# Altium footprint library Atlan.PcbLib: 283 footprints (part 2 of 18)
Each footprint in its own frame and in the unit in brackets; x right, y up, seen from the top. Pads: shape width x height; smd on the part's side, far side on the other; paste and mask are expansions set on the pad; w line width, h text height; cw(c..) or ccw(c..) is an arc to the next point about the centre after c.
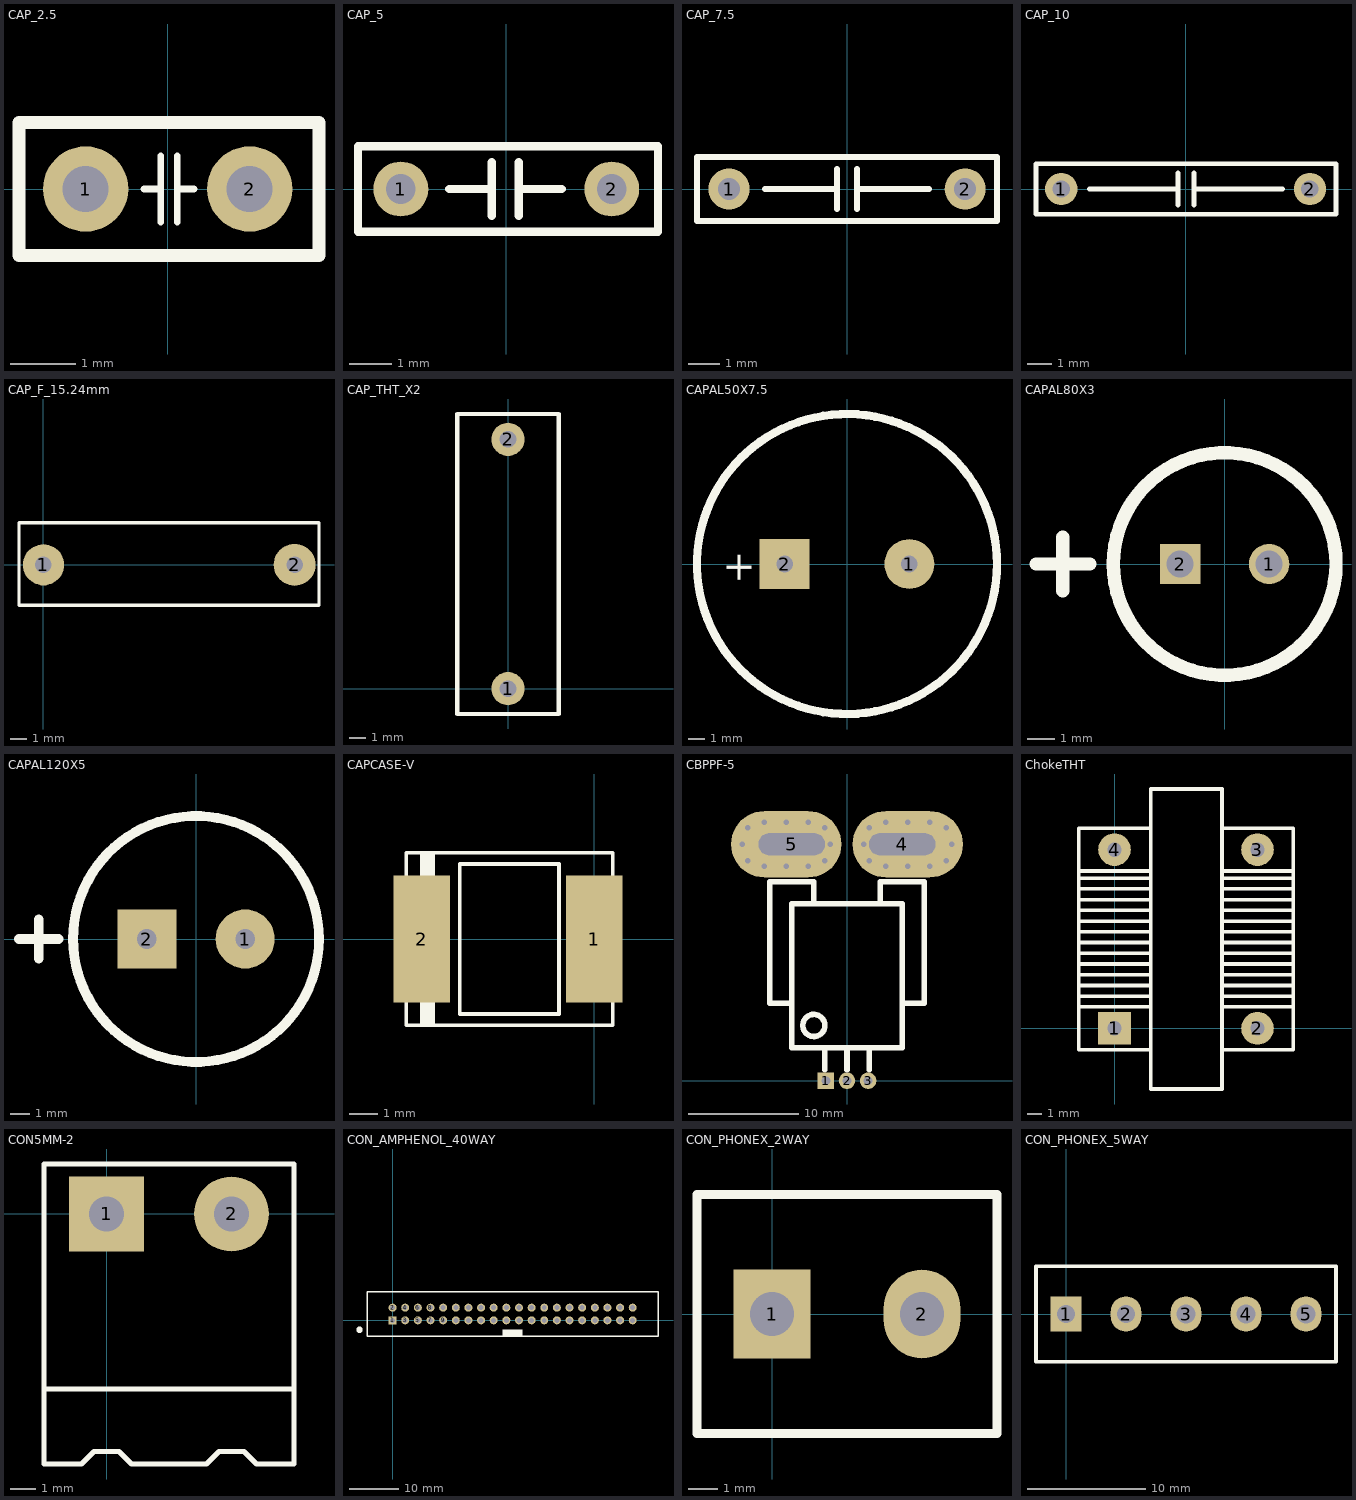
[diagram p1: the footprints below, top view; thin cyan lines are the x and y axes]

## CAP_2.5 [mm]
pads (2):
  round 1.3 hole 0.7: 1(-1.25,0) 2(1.25,0)
Top Overlay:
  lines w0.1: -0.361,0 -0.107,0 ; -0.107,-0.508 -0.107,0.508 ; 0.147,-0.508 0.147,0.508 ; 0.147,0 0.401,0
  lines w0.2: -2.266,-1.016 2.306,-1.016 2.306,1.016 -2.266,1.016 -2.266,-1.016

## CAP_5 [mm]
pads (2):
  round 1.3 hole 0.7: 1(-2.5,0) 2(2.5,0)
Top Overlay:
  lines w0.2: -1.357,0 -0.341,0 ; -0.341,-0.635 -0.341,0.635 ; 0.294,-0.635 0.294,0.635 ; 0.294,0 1.31,0 ; -3.516,-1.016 3.596,-1.016 3.596,1.016 -3.516,1.016 -3.516,-1.016

## CAP_7.5 [mm]
pads (2):
  round 1.3 hole 0.7: 1(-3.75,0) 2(3.75,0)
Top Overlay:
  lines w0.2: -2.607,0 -0.575,0 -0.321,0 ; -0.321,-0.635 -0.321,0.635 ; 0.314,-0.635 0.314,0.635 ; 0.314,0 0.695,0 2.6,0 ; -4.766,-1.016 -4.766,1.016 4.759,1.016 4.759,-1.016 -4.766,-1.016

## CAP_10 [mm]
pads (2):
  round 1.3 hole 0.7: 1(-5,0) 2(5,0)
Top Overlay:
  lines w0.2: -3.857,0 -0.301,0 ; -0.301,-0.635 -0.301,0.635 ; 0.334,-0.635 0.334,0.635 ; 0.334,0 3.89,0 ; -6.016,-1.016 6.049,-1.016 6.049,1.016 -6.016,1.016 -6.016,-1.016

## CAP_F_15.24mm [mm]
pads (2):
  round 2.5 hole 1: 1(0,0)
  round 2.54 hole 1: 2(15.24,0)
Top Overlay:
  lines w0.2: -1.48,-2.45 -1.48,2.55 16.72,2.55 16.72,-2.45 -1.48,-2.45
3D body: height 10.5, standoff 0, extent -1.5,-2.5 16.8,2.6

## CAP_THT_X2 [mm] "X2 capacitor"
height 20
pads (2):
  round 2 hole 1: 1(0,0) 2(0,14.986)
Top Overlay:
  lines w0.254: -3.048,-1.524 3.048,-1.524 3.048,16.51 -3.048,16.51 -3.048,-1.524

## CAPAL50X7.5 [mm]
height 50
pads (2):
  round 3 hole 1: 1(3.75,0)
  rect 3x3 hole 1: 2(-3.75,0)
Top Overlay:
  circle w0.5: c0,0 r9.017
  text "+" at -7.8,0.8 h3
3D body: height 50, standoff 0, extent -8.93,-9.039 8.999,8.925

## CAPAL80X3 [mm]
pads (2):
  round 1.5 hole 1: 1(1.65,0)
  rect 1.5x1.5 hole 1: 2(-1.65,0)
Top Overlay:
  circle w0.5: c0,0 r4.13
  lines w0.5: -7,0 -5,0 ; -6,-1 -6,1
3D body "CAPAL80X3.STEP": height 13.24, standoff -1.94, extent -4.1,-4.141 4.152,4.1

## CAPAL120X5 [mm]
pads (2):
  round 3 hole 1: 1(2.5,0)
  rect 3x3 hole 1: 2(-2.5,0)
Top Overlay:
  circle w0.5: c0,0 r6.25
  lines w0.5: -9,0 -7,0 ; -8,-1 -8,1
3D body "CAPAL120X5.STEP": height 20, standoff -3, extent -6.251,-6.3 6.251,6.186

## CAPCASE-V [mm]
pads (2):
  rect 2x4.5 smd: 1(0,0) 2(-6.103,0)
Top Overlay:
  lines w0.127: -6.103,-3.003 -6.103,3.05 ; -6,-3.05 -6,3.003 ; -5.9,-3.05 -5.9,3.003 ; -5.8,-3.05 -5.8,3.003 ; -5.7,-3.05 -5.7,3.003 ; -6.65,-3.05 0.65,-3.05 0.65,3.05 -6.65,3.05 -6.65,-3.05 ; -4.75,-2.65 -4.75,2.65 -1.25,2.65 -1.25,-2.65 -4.75,-2.65
3D body "Capcase_V_2924.step": height 3.81, standoff 0.01, extent -6.775,-3.15 0.825,3.15

## CBPPF-5 [mm]
pads (5):
  rect 1.5x1.5 hole 0.8: 1(-1.91,0)
  round 1.5 hole 0.8: 2(0,0) 3(1.91,0)
  oval 10x6 hole 2 slot 6 at 0 deg copper offset 0.5,0: 4(5,21.4)
  oval 10x6 hole 2 slot 6 at 0 deg copper offset -0.5,0: 5(-5,21.4)
via 2,22.9 diameter 1 hole 0.5
via 2,19.9 diameter 1 hole 0.5
via 9,19.9 diameter 1 hole 0.5
via 9,22.9 diameter 1 hole 0.5
via 1.5,21.4 diameter 1 hole 0.5
via 9.5,21.4 diameter 1 hole 0.5
via 3.5,23.4 diameter 1 hole 0.5
via 5.5,23.4 diameter 1 hole 0.5
via 7.5,23.4 diameter 1 hole 0.5
via 3.5,19.4 diameter 1 hole 0.5
via 5.5,19.4 diameter 1 hole 0.5
via 7.5,19.4 diameter 1 hole 0.5
via -2,19.9 diameter 1 hole 0.5
via -2,22.9 diameter 1 hole 0.5
via -9,22.9 diameter 1 hole 0.5
via -9,19.9 diameter 1 hole 0.5
via -1.5,21.4 diameter 1 hole 0.5
via -9.5,21.4 diameter 1 hole 0.5
via -3.5,19.4 diameter 1 hole 0.5
via -5.5,19.4 diameter 1 hole 0.5
via -7.5,19.4 diameter 1 hole 0.5
via -3.5,23.4 diameter 1 hole 0.5
via -5.5,23.4 diameter 1 hole 0.5
via -7.5,23.4 diameter 1 hole 0.5
Top Overlay:
  circle w0.5: c-3,5 r1
  lines w0.5: -5,7 -7,7 -7,18 -3,18 -3,16 ; -2,1 -2,3 ; 0,1 0,3 ; 2,1 2,3 ; 3,16 3,18 7,18 7,7 5,7 ; -5,3 5,3 5,16 -5,16 -5,3
3D body "SW3dPS-ACS754SCB-200-PFF.STEP": height 7, standoff -3.51, extent -7,-0.411 7,22.411

## ChokeTHT [mm] "common mode choke"
pads (4):
  rect 2.286x2.286 hole 1: 1(0,0)
  round 2.286 hole 1: 2(10,0) 3(10,12.5) 4(0,12.5)
Top Overlay:
  lines w0.254: -2.5,1.5 2.5,1.5 ; -2.5,2.25 2.5,2.25 ; -2.5,3 2.5,3 ; -2.5,3.75 2.5,3.75 ; -2.5,4.5 2.5,4.5 ; -2.5,5.25 2.5,5.25 ; -2.5,6 2.5,6 ; -2.5,6.75 2.5,6.75 ; -2.5,7.5 2.5,7.5 ; -2.5,8.25 2.5,8.25 ; -2.5,9 2.5,9 ; -2.5,9.75 2.5,9.75 ; -2.5,10.5 2.5,10.5 ; -2.5,11 2.5,11 ; 2.5,-1.5 -2.5,-1.5 -2.5,14 2.5,14 ; 7.5,-1.5 12.5,-1.5 12.5,14 7.5,14 ; 7.5,1.5 12.5,1.5 ; 7.5,2.25 12.5,2.25 ; 7.5,3 12.5,3 ; 7.5,3.75 12.5,3.75 ; 7.5,4.5 12.5,4.5 ; 7.5,5.25 12.5,5.25 ; 7.5,6 12.5,6 ; 7.5,6.75 12.5,6.75 ; 7.5,7.5 12.5,7.5 ; 7.5,8.25 12.5,8.25 ; 7.5,9 12.5,9 ; 7.5,9.75 12.5,9.75 ; 7.5,10.5 12.5,10.5 ; 7.5,11 12.5,11 ; 2.54,-4.242 2.54,16.739 7.518,16.739 7.518,-4.242 2.54,-4.242

## CON5MM-2 [mm]
pads (2):
  rect 3x3 hole 1.4: 1(0,0)
  round 3 hole 1.4: 2(5,0)
Top Overlay:
  lines w0.203: -2.5,-7 7.5,-7 ; -2.5,-10 -2.5,2 7.5,2 7.5,-10 6,-10 5.5,-9.5 4.5,-9.5 4,-10 1,-10 0.5,-9.5 -0.5,-9.5 -1,-10 -2.5,-10

## CON_AMPHENOL_40WAY [mm]
height 9
pads (40):
  rect 1.6x1.6 hole 1: 1(0,0)
  round 1.6 hole 1: 2(0,2.54) 3(2.54,0) 4(2.54,2.54) 5(5.08,0) 6(5.08,2.54) 7(7.62,0) 8(7.62,2.54) 9(10.16,0) 10(10.16,2.54) 11(12.7,0) 12(12.7,2.54) 13(15.24,0) 14(15.24,2.54) 15(17.78,0) 16(17.78,2.54) 17(20.32,0) 18(20.32,2.54) 19(22.86,0) 20(22.86,2.54) 21(25.4,0) 22(25.4,2.54) 23(27.94,0) 24(27.94,2.54) 25(30.48,0) 26(30.48,2.54) 27(33.02,0) 28(33.02,2.54) 29(35.56,0) 30(35.56,2.54) 31(38.1,0) 32(38.1,2.54) 33(40.64,0) 34(40.64,2.54) 35(43.18,0) 36(43.18,2.54) 37(45.72,0) 38(45.72,2.54) 39(48.26,0) 40(48.26,2.54)
Top Overlay:
  circle w0.7: c-6.65,-1.905 r0.3
  rectangle: 22.225,-3.205 26.035,-1.905
  lines w0.17: 22.225,-3.175 22.225,-1.905 26.035,-1.905 26.035,-3.205
  lines w0.3: -5.08,-3.205 -5.08,5.745 53.34,5.745 53.34,-3.205 -5.08,-3.205

## CON_PHONEX_2WAY [mm]
height 10
pads (2):
  rect 2.6x3 hole 1.5: 1(0,0)
  oval 2.6x3 hole 1.5: 2(5.08,0)
Top Overlay:
  lines w0.3: -2.54,-4.05 7.62,-4.05 7.62,4.05 -2.54,4.05 -2.54,-4.05

## CON_PHONEX_5WAY [mm]
height 10
pads (5):
  rect 2.6x3 hole 1.5: 1(0,0)
  oval 2.6x3 hole 1.5: 2(5.08,0)
  oval 2.6x3 hole 1.6: 3(10.16,0) 4(15.24,0) 5(20.32,0)
Top Overlay:
  lines w0.3: -2.54,-4.05 -2.54,4.05 22.86,4.05 22.86,-4.05 -2.54,-4.05